# Altium footprint library SparkFun.PCBLIB: 674 footprints (part 17 of 44)
Each footprint in its own frame and in the unit in brackets; x right, y up, seen from the top. Pads: shape width x height; smd on the part's side, far side on the other; paste and mask are expansions set on the pad; w line width, h text height; cw(c..) or ccw(c..) is an arc to the next point about the centre after c.
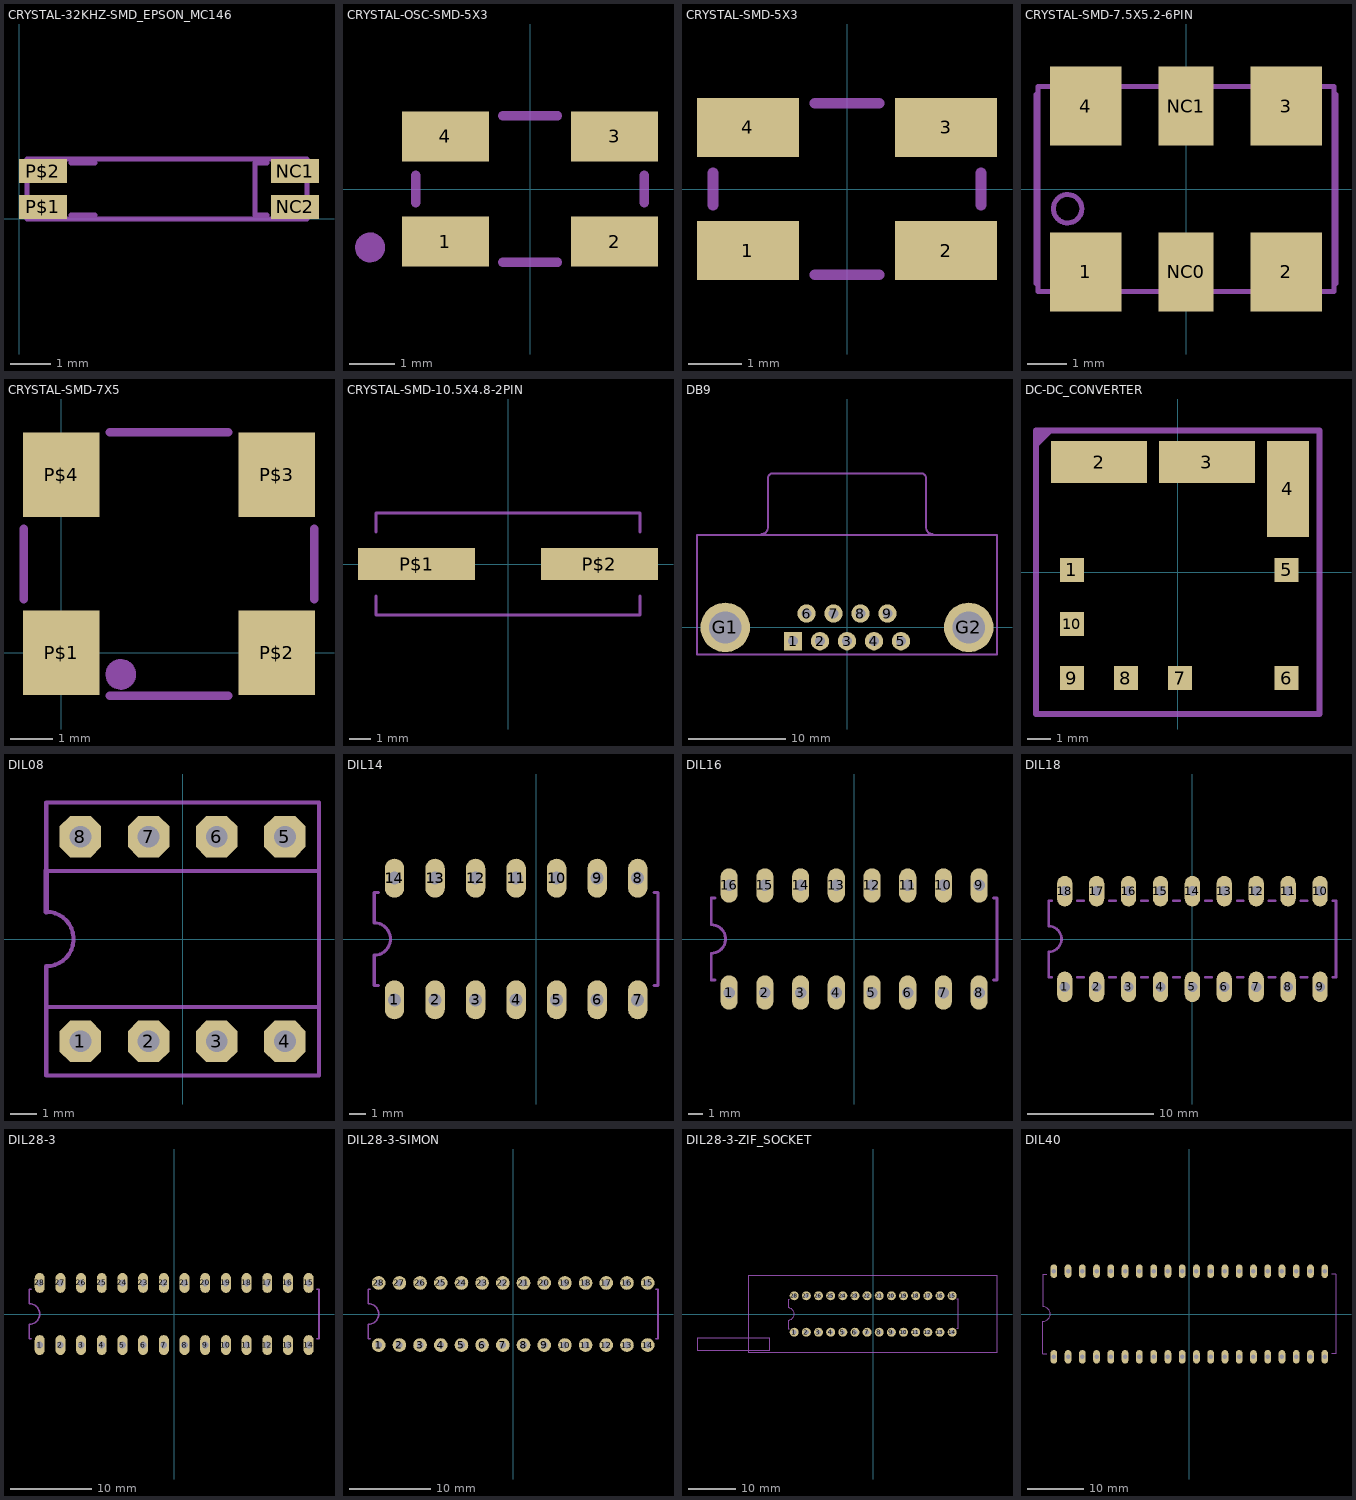
[diagram p16: the footprints below, top view; thin cyan lines are the x and y axes]

## CRYSTAL-32KHZ-SMD_EPSON_MC146 [mil]
pads (4):
  rect 47.24x23.62 smd: NC1(271.65,47.24) NC2(271.65,11.81) P$1(23.62,11.81) P$2(23.62,47.24)
Mechanical 2:
  lines w5: 51.18,3.94 74.8,3.94 ; 51.18,55.12 74.8,55.12 ; 244.09,3.94 232.28,3.94 232.28,55.12 244.09,55.12
Mechanical 18:
  lines w5: 7.87,0 283.46,0 283.46,59.06 7.87,59.06 7.87,0

## CRYSTAL-OSC-SMD-5X3 [mil]
pads (4):
  rect 74.8x43.31 smd: 1(-72.83,-45.28) 2(72.83,-45.28) 3(72.83,45.28) 4(-72.83,45.28)
Mechanical 2:
  circle w5: c-137.74,-50.37 r10.44
  circle w5: c-137.74,-50.37 r5.73
  circle w5: c-137.74,-50.37 r1.12
  lines w8: -98.43,-11.81 -98.43,11.81 ; -23.62,-62.99 23.62,-62.99 ; -23.62,62.99 23.62,62.99 ; 98.43,-11.81 98.43,11.81

## CRYSTAL-SMD-5X3 [mil]
pads (4):
  rect 74.8x43.31 smd: 1(-72.83,-45.28) 2(72.83,-45.28) 3(72.83,45.28) 4(-72.83,45.28)
Mechanical 2:
  lines w8: -98.43,-11.81 -98.43,11.81 ; -23.62,-62.99 23.62,-62.99 ; -23.62,62.99 23.62,62.99 ; 98.43,-11.81 98.43,11.81

## CRYSTAL-SMD-7.5X5.2-6PIN [mm]
pads (6):
  rect 1.8x2 smd: 1(-2.54,-2.1) 2(2.54,-2.1) 3(2.54,2.1) 4(-2.54,2.1)
  rect 1.4x2 smd: NC0(0,-2.1) NC1(0,2.1)
Mechanical 2:
  circle w0.127: c-3,-0.5 r0.36
  lines w0.127: -3.8,-2.4 -3.8,2.4 ; 3.8,-2.4 3.8,2.4
Mechanical 18:
  lines w0.127: -3.75,-2.6 -3.75,2.6 3.75,2.6 3.75,-2.6 -3.75,-2.6

## CRYSTAL-SMD-7X5 [mm]
pads (4):
  rect 1.8x2 smd: P$1(0,0) P$2(5.08,0) P$3(5.08,4.2) P$4(0,4.2)
Mechanical 2:
  circle w0.127: c1.402,-0.51 r0.3
  circle w0.127: c1.402,-0.51 r0.224
  circle w0.127: c1.402,-0.51 r0.1
  lines w0.127: 1.402,-0.609 1.402,-0.409
  lines w0.203: -0.889,1.27 -0.889,2.921 ; 1.143,-1.016 3.937,-1.016 ; 1.143,5.207 3.937,5.207 ; 5.969,1.27 5.969,2.921

## CRYSTAL-SMD-10.5X4.8-2PIN [mil]
pads (2):
  rect 216.54x59.06 smd: P$1(-169.29,0) P$2(169.29,0)
Mechanical 2:
  lines w5: -244.09,-59.06 -244.09,-94.49 244.09,-94.49 244.09,-59.06 ; -244.09,59.06 -244.09,94.49 244.09,94.49 244.09,59.06

## DB9 [mil]
pads (11):
  rect 74x74 hole 40: 1(-218.11,-55.91)
  round 74 hole 40: 2(-109.06,-55.91) 3(0,-55.91) 4(109.06,-55.91) 5(218.11,-55.91) 6(-163.39,55.91) 7(-54.33,55.91) 8(54.33,55.91) 9(163.39,55.91)
  round 200 hole 130: G1(-492.13,0) G2(492.13,0)
Mechanical 2:
  lines w8: -606.3,-110.24 -606.3,374.02 606.3,374.02 606.3,-110.24 -606.3,-110.24
Mechanical 18:
  lines w8: -345,377.32 ccw(c-345,402.32) -320,402.32 -320,602.32 cw(c-300,602.32) -300,622.32 300,622.32 cw(c300,602.32) 320,602.32 320,402.32 ccw(c345,402.32) 345,377.32

## DC-DC_CONVERTER [mil]
pads (10):
  rect 39.76x39.76 smd: 1(-176.38,3.94) 5(181.5,3.94) 6(181.5,-176.38) 7(3.94,-176.38) 8(-86.22,-176.38) 9(-176.38,-176.38) 10(-176.38,-86.22)
  rect 160.24x69.69 smd: 2(-131.1,183.86) 3(48.82,183.86)
  rect 69.69x160.24 smd: 4(183.86,138.98)
Mechanical 2:
  lines w7: -233,214 -213,234 ; -235.16,-235.16 235.16,-235.16 235.16,235.16 -235.16,235.16 -235.16,-235.16
  lines w10: -233,224 -224,233
Mechanical 18:
  lines w9.84: -236.22,-236.22 236.22,-236.22 236.22,236.22 -236.22,236.22 -236.22,-236.22

## DIL08 [mil]
pads (8):
  oct 61x61 hole 32: 1(-150,-150) 2(-50,-150) 3(50,-150) 4(150,-150) 5(150,150) 6(50,150) 7(-50,150) 8(-150,150)
Mechanical 2:
  lines w6: -200,40 cw(c-200,0) -200,-40 -200,-100 ; -200,-100 -200,-200 200,-200 200,-100 ; -200,-100 200,-100 ; 200,-100 200,100 ; 200,100 200,200 -200,200 -200,100 200,100
  lines w8: -200,40 -200,100

## DIL14 [mil]
pads (14):
  oval 48x96 hole 32: 1(-350,-150) 2(-250,-150) 3(-150,-150) 4(-50,-150) 5(50,-150) 6(150,-150) 7(250,-150) 8(250,150) 9(150,150) 10(50,150) 11(-50,150) 12(-150,150) 13(-250,150) 14(-350,150)
Mechanical 2:
  lines w8: -390,-115 -400,-115 -400,-40 ccw(c-400,0) -400,40 -400,115 -390,115 ; 290,-115 300,-115 300,115 290,115

## DIL16 [mil]
pads (16):
  oval 48x96 hole 32: 1(-350,-150) 2(-250,-150) 3(-150,-150) 4(-50,-150) 5(50,-150) 6(150,-150) 7(250,-150) 8(350,-150) 9(350,150) 10(250,150) 11(150,150) 12(50,150) 13(-50,150) 14(-150,150) 15(-250,150) 16(-350,150)
Mechanical 2:
  lines w8: -390,-115 -400,-115 -400,-40 ccw(c-400,0) -400,40 -400,115 -390,115 ; 390,-115 400,-115 400,115 390,115

## DIL18 [mil]
pads (18):
  oval 48x96 hole 32: 1(-400,-150) 2(-300,-150) 3(-200,-150) 4(-100,-150) 5(0,-150) 6(100,-150) 7(200,-150) 8(300,-150) 9(400,-150) 10(400,150) 11(300,150) 12(200,150) 13(100,150) 14(0,150) 15(-100,150) 16(-200,150) 17(-300,150) 18(-400,150)
Mechanical 2:
  lines w8: -440,-120 -450,-120 -450,-40 ccw(c-450,0) -450,40 -450,120 -440,120 ; -360,-120 -340,-120 ; -360,120 -340,120 ; -260,-120 -240,-120 ; -260,120 -240,120 ; -160,-120 -140,-120 ; -160,120 -140,120 ; -60,-120 -40,-120 ; -60,120 -40,120 ; 40,-120 60,-120 ; 40,120 60,120 ; 140,-120 160,-120 ; 140,120 160,120 ; 240,-120 260,-120 ; 240,120 260,120 ; 340,-120 360,-120 ; 340,120 360,120 ; 440,-120 450,-120 450,120 440,120

## DIL28-3 [mil]
pads (28):
  oval 48x96 hole 32: 1(-650,-150) 2(-550,-150) 3(-450,-150) 4(-350,-150) 5(-250,-150) 6(-150,-150) 7(-50,-150) 8(50,-150) 9(150,-150) 10(250,-150) 11(350,-150) 12(450,-150) 13(550,-150) 14(650,-150) 15(650,150) 16(550,150) 17(450,150) 18(350,150) 19(250,150) 20(150,150) 21(50,150) 22(-50,150) 23(-150,150) 24(-250,150) 25(-350,150) 26(-450,150) 27(-550,150) 28(-650,150)
Mechanical 2:
  lines w8: -690,-120 -700,-120 -700,-50 ccw(c-700,0) -700,50 -700,120 -690,120 ; 690,-120 700,-120 700,120 690,120

## DIL28-3-SIMON [mil]
pads (28):
  round 66 hole 32: 1(-650,-150) 2(-550,-150) 3(-450,-150) 4(-350,-150) 5(-250,-150) 6(-150,-150) 7(-50,-150) 8(50,-150) 9(150,-150) 10(250,-150) 11(350,-150) 12(450,-150) 13(550,-150) 14(650,-150) 15(650,150) 16(550,150) 17(450,150) 18(350,150) 19(250,150) 20(150,150) 21(50,150) 22(-50,150) 23(-150,150) 24(-250,150) 25(-350,150) 26(-450,150) 27(-550,150) 28(-650,150)
Mechanical 2:
  lines w8: -690,-120 -700,-120 -700,-50 ccw(c-700,0) -700,50 -700,120 -690,120 ; 690,-120 700,-120 700,120 690,120

## DIL28-3-ZIF_SOCKET [mil]
pads (28):
  round 74 hole 40: 1(-650,-150) 2(-550,-150) 3(-450,-150) 4(-350,-150) 5(-250,-150) 6(-150,-150) 7(-50,-150) 8(50,-150) 9(150,-150) 10(250,-150) 11(350,-150) 12(450,-150) 13(550,-150) 14(650,-150) 15(650,150) 16(550,150) 17(450,150) 18(350,150) 19(250,150) 20(150,150) 21(50,150) 22(-50,150) 23(-150,150) 24(-250,150) 25(-350,150) 26(-450,150) 27(-550,150) 28(-650,150)
Mechanical 2:
  lines w8: -690,-120 -700,-120 -700,-50 ccw(c-700,0) -700,50 -700,120 -690,120 ; 690,-120 700,-120 700,120 690,120
Mechanical 18:
  lines w5: -1027.99,-314.96 1019.25,-314.96 1019.25,314.96 -1027.99,314.96 -1027.99,-314.96
  lines w10: -1450,-300 -1450,-200 -850,-200 -850,-300 -1450,-300

## DIL40 [mil]
pads (40):
  oval 47.25x94.5 hole 31.5: 1(-950,-300) 2(-850,-300) 3(-750,-300) 4(-650,-300) 5(-550,-300) 6(-450,-300) 7(-350,-300) 8(-250,-300) 9(-150,-300) 10(-50,-300) 11(50,-300) 12(150,-300) 13(250,-300) 14(350,-300) 15(450,-300) 16(550,-300) 17(650,-300) 18(750,-300) 19(850,-300) 20(950,-300) 21(950,300) 22(850,300) 23(750,300) 24(650,300) 25(550,300) 26(450,300) 27(350,300) 28(250,300) 29(150,300) 30(50,300) 31(-50,300) 32(-150,300) 33(-250,300) 34(-350,300) 35(-450,300) 36(-550,300) 37(-650,300) 38(-750,300) 39(-850,300) 40(-950,300)
Mechanical 2:
  lines w6: -1029,-50 -1029,-280 -1000,-280 ; -1029,50 -1029,280 -1000,280 ; -1025,-50 ccw(c-1025,0) -1025,50 ; 1000,-280 1029,-280 1029,280 1000,280